# Altium footprint library Footprints.PcbLib: 236 footprints (part 13 of 15)
Each footprint in its own frame and in the unit in brackets; x right, y up, seen from the top. Pads: shape width x height; smd on the part's side, far side on the other; paste and mask are expansions set on the pad; w line width, h text height; cw(c..) or ccw(c..) is an arc to the next point about the centre after c.
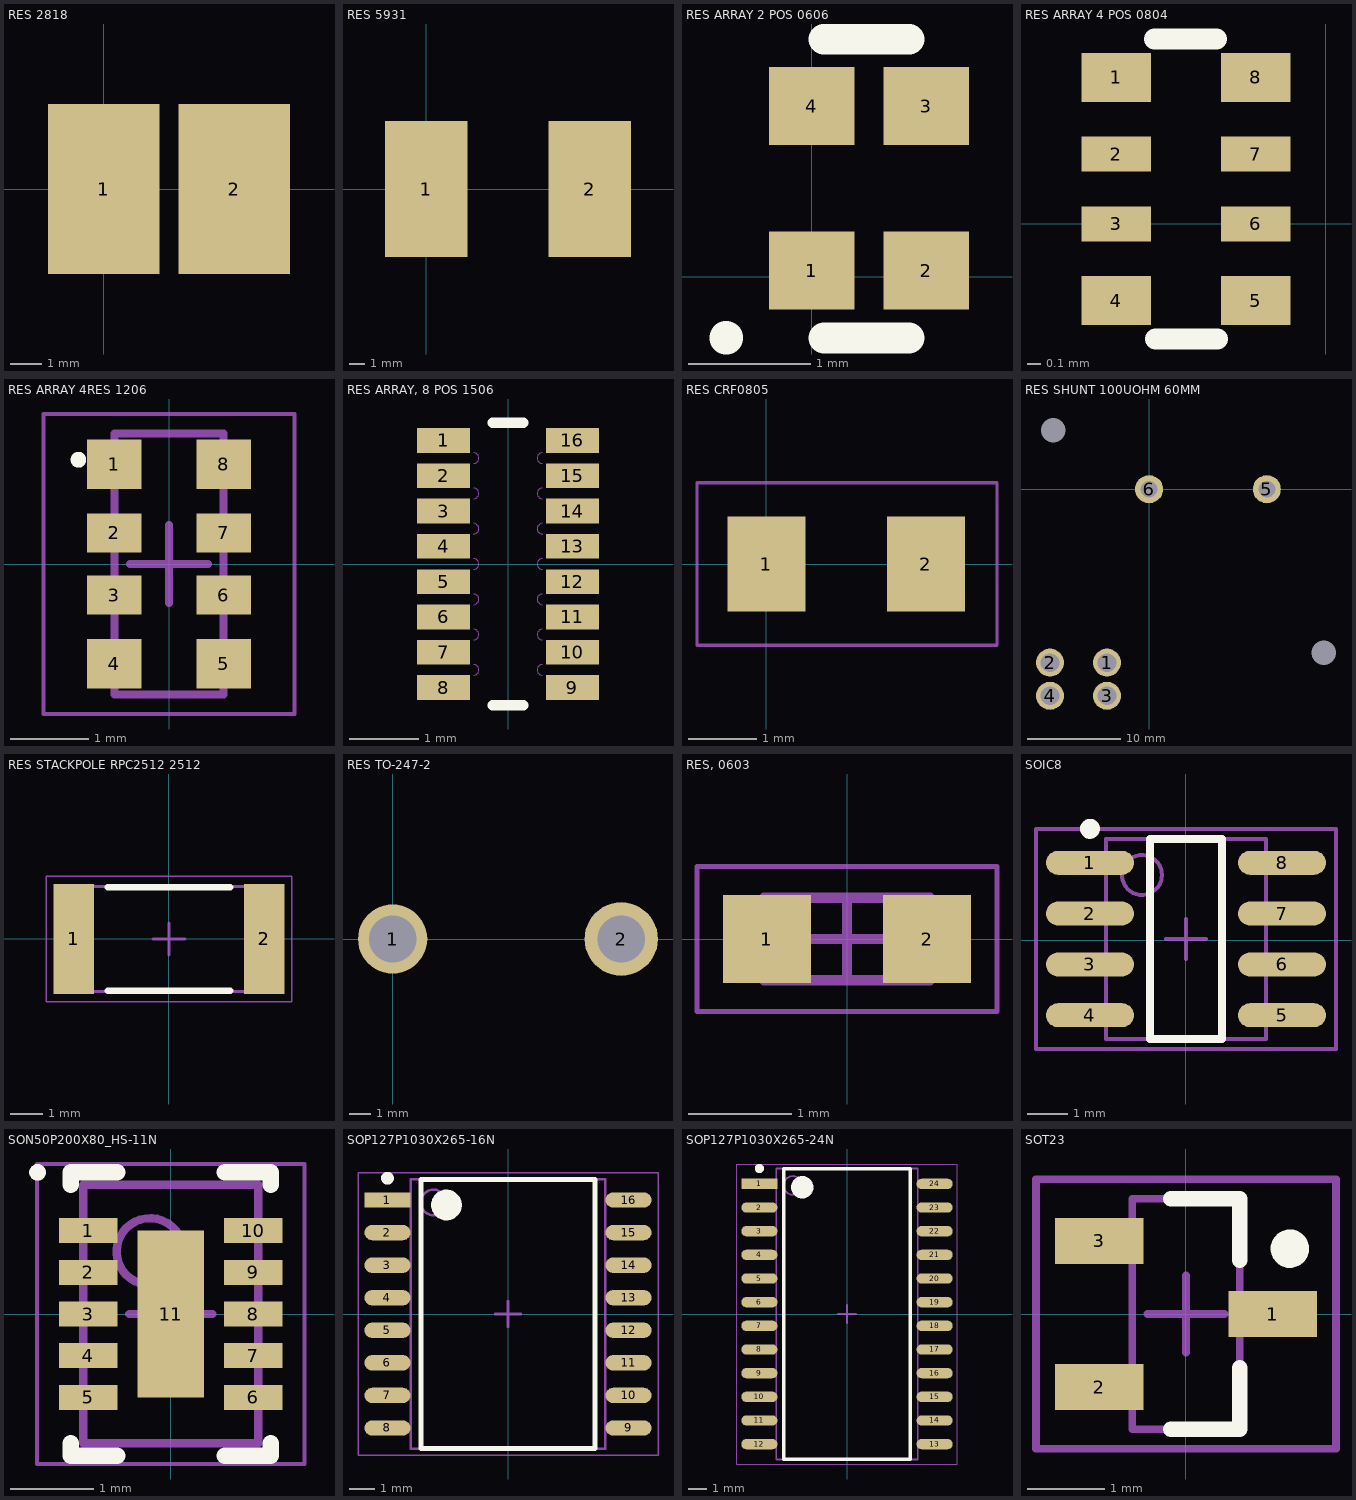
[diagram p12: the footprints below, top view; thin cyan lines are the x and y axes]

## RES 2818 [mm]
pads (2):
  rect 3.51x5.33 smd: 1(0,0) 2(4.1,0)
3D body "WSHM2818.stp": height 1.35, standoff -0.15, extent -1.525,-2.325 5.575,2.275

## RES 5931 [mm]
pads (2):
  rect 5.45x9 smd: 1(0,0) 2(10.8,0)
3D body "WSL5931 (0.003).stp": height 0.77, standoff 0, extent -2.25,-4 12.75,3.75

## RES ARRAY 2 POS 0606 [mm]
pads (4):
  rect 0.7x0.64 smd: 1(0,0.05) 2(0.94,0.05) 3(0.94,1.4) 4(0,1.4)
Top Overlay:
  circle w0.254: c-0.7,-0.5 r0.01
  lines w0.254: 0.1,-0.5 0.8,-0.5 ; 0.1,1.95 0.8,1.95
3D body "ACAS_0606.stp": height 0.45, standoff 0, extent -0.281,-0.072 1.219,1.528

## RES ARRAY 4 POS 0804 [mm] "Panasonic Electronic Components EXB-N8V511JX"
height 0.7
pads (8):
  rect 0.5x0.35 smd: 1(-1.5,1.05) 4(-1.5,-0.55) 5(-0.5,-0.55) 8(-0.5,1.05)
  rect 0.5x0.25 smd: 2(-1.5,0.5) 3(-1.5,0) 6(-0.5,0) 7(-0.5,0.5)
Top Overlay:
  lines w0.152: -1.225,1.325 -0.781,1.325 ; -1.219,-0.825 -0.775,-0.825
3D body "User Library-4xRes_0402.step": height 0.36, standoff -0.01, extent -1.5,-0.75 -0.5,1.25

## RES ARRAY 4RES 1206 [mm] "Chip Array, Flat, 8-Leads, Pitch 0.80mm,  Body 3.20x1.60mm,  IPC Medium Density"
height 1
pads (8):
  rect 0.7x0.64 smd: 1(-0.7,1.28) 4(-0.7,-1.28) 5(0.7,-1.28) 8(0.7,1.28)
  rect 0.7x0.5 smd: 2(-0.7,0.4) 3(-0.7,-0.4) 6(0.7,-0.4) 7(0.7,0.4)
Top Overlay:
  circle w0.1: c-1.162,1.338 r0.05
Mechanical 13:
  lines w0.1: -0.7,-1.675 -0.7,1.675 0.7,1.675 0.7,-1.675 -0.7,-1.675
Mechanical 15:
  lines w0.05: -1.61,-1.925 -1.61,1.925 1.61,1.925 1.61,-1.925 -1.61,-1.925
  lines w0.1: -0.5,0 0.5,0 ; 0,-0.5 0,0.5
3D body "ACAS 0612.stp": height 0.45, standoff 0, extent -0.813,-1.6 0.687,1.6

## RES ARRAY, 8 POS 1506 [mil]
pads (16):
  rect 30x14 smd: 1(-36.5,70) 2(-36.5,50) 3(-36.5,30) 4(-36.5,10) 5(-36.5,-10) 6(-36.5,-30) 7(-36.5,-50) 8(-36.5,-70) 9(36.5,-70) 10(36.5,-50) 11(36.5,-30) 12(36.5,-10) 13(36.5,10) 14(36.5,30) 15(36.5,50) 16(36.5,70)
Top Overlay:
  lines w6: -8.75,-80 8.75,-80 ; -8.75,80 8.75,80
Mechanical 13:
  lines w0: -19.5,-63 ccw(c-19.5,-60) -19.5,-57 ; -19.5,-43 ccw(c-19.5,-40) -19.5,-37 ; -19.5,-23 ccw(c-19.5,-20) -19.5,-17 ; -19.5,-3 ccw(c-19.5,0) -19.5,3 ; -19.5,17 ccw(c-19.5,20) -19.5,23 ; -19.5,37 ccw(c-19.5,40) -19.5,43 ; -19.5,57 ccw(c-19.5,60) -19.5,63 ; 19.5,-63 cw(c19.5,-60) 19.5,-57 ; 19.5,-43 cw(c19.5,-40) 19.5,-37 ; 19.5,-23 cw(c19.5,-20) 19.5,-17 ; 19.5,-3 cw(c19.5,0) 19.5,3 ; 19.5,17 cw(c19.5,20) 19.5,23 ; 19.5,37 cw(c19.5,40) 19.5,43 ; 19.5,57 cw(c19.5,60) 19.5,63
3D body "EXB2HV.stp": height 18.03, standoff 0, extent -20.51,-77.01 20.51,77.01

## RES CRF0805 [mm]
pads (2):
  rect 1.15x1.4 smd: 1(0,0) 2(2.35,0)
Mechanical 15:
  lines w0.05: -1.025,-1.2 -1.025,1.2 3.4,1.2 3.4,-1.2 -1.025,-1.2
3D body "CRF0805-FX-R005ELF--3DModel-STEP-46669.STEP": height 0.8, standoff 0, extent 0.2,-0.625 2.2,0.625

## RES SHUNT 100UOHM 60MM [mm]
pads (8):
  round 0 hole 2.6: 0(-10.25,6.3) 0(18.7,-17.5)
  round 3 hole 2: 1(-4.5,-18.55) 2(-10.6,-18.55) 3(-4.5,-22.1) 4(-10.6,-22.1)
  round 3 hole 1.8: 5(12.6,0) 6(0,0)
3D body "WSBM8518_100µO.STEP": height 6.58, standoff -21.08, extent -36.002,-29.031 48.986,11.463

## RES STACKPOLE RPC2512 2512 [mm] "Chip Resistor, 2-Leads, Body 6.30x3.10mm, IPC Medium Density"
height 0.65
pads (2):
  rect 1.25x3.4 smd: 1(-2.95,0) 2(2.95,0)
Top Overlay:
  lines w0.2: -1.9,-1.6 1.9,-1.6 ; -1.9,1.6 1.9,1.6
Mechanical 13:
  lines w0.1: -3.175,-1.625 3.175,-1.625 3.175,1.625 -3.175,1.625 -3.175,-1.625
Mechanical 15:
  lines w0.05: -3.8,-1.95 3.8,-1.95 3.8,1.95 -3.8,1.95 -3.8,-1.95
  lines w0.1: -0.5,0 0.5,0 ; 0,-0.5 0,0.5
3D body "RES STACKPOLE RPC2512 2512.step": height 0.65, standoff 0, extent -3.175,-1.625 3.175,1.625

## RES TO-247-2 [mm]
pads (2):
  round 3.3 hole 2.25: 1(0,0)
  round 3.5 hole 2.25: 2(10.88,0)
3D body: height 33.5, standoff -5.5, extent 10.88,0 10.88,0
3D body: height 30.47, standoff -5.5, extent 10.88,0 10.88,0
3D body "TO-247H.SLDPRT": height 25.5, standoff -10.47, extent -2.37,-2.75 13.13,2.25

## RES, 0603 [mm] "Chip Resistor, 2-Leads, Body 1.60x0.80mm, IPC Medium Density"
height 0.55
pads (2):
  rect 0.85x0.85 smd: 1(-0.775,0) 2(0.775,0)
Mechanical 13:
  lines w0.1: -0.8,-0.4 -0.8,0.4 0.8,0.4 0.8,-0.4 -0.8,-0.4
Mechanical 15:
  lines w0.05: -1.45,-0.7 -1.45,0.7 1.45,0.7 1.45,-0.7 -1.45,-0.7
  lines w0.1: -0.4,0 0.4,0 ; 0,-0.4 0,0.4
3D body "RESC1608X06N.step": height 0.55, standoff 0, extent -0.8,-0.4 0.8,0.4

## SOIC8 [mm]
pads (8):
  oval 2.2x0.6 smd: 1(-2.394,1.935) 2(-2.394,0.665) 3(-2.394,-0.605) 4(-2.394,-1.875) 5(2.406,-1.875) 6(2.406,-0.605) 7(2.406,0.665) 8(2.406,1.935)
Top Overlay:
  circle w0.25: c-2.394,2.785 r0.125
  lines w0.2: -0.894,-2.47 0.906,-2.47 0.906,2.53 -0.894,2.53 -0.894,-2.47
Mechanical 13:
  circle w0.1: c-1.094,1.63 r0.5
  lines w0.1: -1.994,-2.47 2.006,-2.47 2.006,2.53 -1.994,2.53 -1.994,-2.47
Mechanical 15:
  lines w0.1: -0.494,0.03 0.506,0.03 ; 0.006,-0.47 0.006,0.53 ; -3.744,-2.72 3.756,-2.72 3.756,2.78 -3.744,2.78 -3.744,-2.72
3D body: height 1.75, standoff 0, extent -1.994,-2.47 2.006,2.53

## SON50P200X80_HS-11N [mm] "SON, 10-Leads, Body 3.00x2.00mm, Pitch 0.50mm, Thermal Pad 2.00x0.69mm, IPC Medium Density"
height 0.8
pads (11):
  rect 0.7x0.3 smd: 1(-0.99,1) 2(-0.99,0.5) 3(-0.99,0) 4(-0.99,-0.5) 5(-0.99,-1) 6(0.99,-1) 7(0.99,-0.5) 8(0.99,0) 9(0.99,0.5) 10(0.99,1)
  rect 0.8x2 smd: 11(0,0)
Top Overlay:
  circle w0.1: c-1.6,1.7 r0.05
  lines w0.2: -1.2,-1.55 -1.2,-1.7 -0.645,-1.7 ; -1.2,1.55 -1.2,1.7 -0.645,1.7 ; 0.645,-1.7 1.2,-1.7 1.2,-1.55 ; 0.645,1.7 1.2,1.7 1.2,1.55
Mechanical 13:
  circle w0.1: c-0.25,0.75 r0.4
  lines w0.1: -1.05,-1.55 1.05,-1.55 1.05,1.55 -1.05,1.55 -1.05,-1.55
Mechanical 15:
  lines w0.05: -1.605,-1.8 1.605,-1.8 1.605,1.8 -1.605,1.8 -1.605,-1.8
  lines w0.1: -0.5,0 0.5,0 ; 0,-0.5 0,0.5
3D body "SON50P200X80_HS-11N.step": height 0.8, standoff 0, extent -1.051,-1.55 1.051,1.55

## SOP127P1030X265-16N [mm] "SOP, 16-Leads, Body 10.30x7.51mm, Pitch 1.27mm, IPC Medium Density"
height 2.65
pads (16):
  rect 1.8x0.6 smd: 1(-4.7,4.445)
  oval 1.8x0.6 smd: 2(-4.7,3.175) 3(-4.7,1.905) 4(-4.7,0.635) 5(-4.7,-0.635) 6(-4.7,-1.905) 7(-4.7,-3.175) 8(-4.7,-4.445) 9(4.7,-4.445) 10(4.7,-3.175) 11(4.7,-1.905) 12(4.7,-0.635) 13(4.7,0.635) 14(4.7,1.905) 15(4.7,3.175) 16(4.7,4.445)
Top Overlay:
  circle w0.25: c-4.7,5.295 r0.125
  circle w0.6: c-2.4,4.25 r0.3
  lines w0.2: -3.4,-5.25 -3.4,5.25 3.4,5.25 3.4,-5.25 -3.4,-5.25
Assembly Top (Mech9):
  circle w0.1: c-2.9,4.35 r0.5
  lines w0.1: -3.8,-5.25 -3.8,5.25 3.8,5.25 3.8,-5.25 -3.8,-5.25
Courtyard Top (Mech11):
  lines w0.05: -5.85,-5.5 -5.85,5.5 5.85,5.5 5.85,-5.5 -5.85,-5.5
  lines w0.1: -0.5,0 0.5,0 ; 0,-0.5 0,0.5
3D body "SOP127P1030X265-16N.step": height 2.65, standoff 0, extent -5.15,-5.25 5.15,5.25

## SOP127P1030X265-24N [mm] "SOP, 24-Leads, Body 15.40x7.50mm, Pitch 1.27mm, IPC Medium Density"
height 2.65
pads (24):
  rect 1.95x0.55 smd: 1(-4.7,6.985)
  oval 1.95x0.55 smd: 2(-4.7,5.715) 3(-4.7,4.445) 4(-4.7,3.175) 5(-4.7,1.905) 6(-4.7,0.635) 7(-4.7,-0.635) 8(-4.7,-1.905) 9(-4.7,-3.175) 10(-4.7,-4.445) 11(-4.7,-5.715) 12(-4.7,-6.985) 13(4.7,-6.985) 14(4.7,-5.715) 15(4.7,-4.445) 16(4.7,-3.175) 17(4.7,-1.905) 18(4.7,-0.635) 19(4.7,0.635) 20(4.7,1.905) 21(4.7,3.175) 22(4.7,4.445) 23(4.7,5.715) 24(4.7,6.985)
Top Overlay:
  circle w0.6: c-2.4,6.8 r0.3
  circle w0.25: c-4.7,7.81 r0.125
  lines w0.2: -3.4,-7.8 3.4,-7.8 3.4,7.8 -3.4,7.8 -3.4,-7.8
Mechanical 13:
  circle w0.1: c-2.9,6.9 r0.5
  lines w0.1: -3.8,-7.8 3.8,-7.8 3.8,7.8 -3.8,7.8 -3.8,-7.8
Mechanical 15:
  lines w0.05: -5.925,-8.05 5.925,-8.05 5.925,8.05 -5.925,8.05 -5.925,-8.05
  lines w0.1: -0.5,0 0.5,0 ; 0,-0.5 0,0.5
3D body "SOP127P1030X265-24N.step": height 2.65, standoff 0, extent -5.15,-7.8 5.15,7.8

## SOT23 [mm] "SOT23, 3-Leads, Body 2.9x1.3mm, Pitch 0.95mm, Lead Span 2.3mm - Reverse Pinning, IPC Medium Density"
height 1.1
pads (3):
  rect 1.15x0.6 smd: 1(1.125,0) 2(-1.125,-0.95) 3(-1.125,0.95)
Top Overlay:
  circle w0.25: c1.35,0.85 r0.125
  lines w0.2: -0.2,-1.5 0.7,-1.5 0.7,-0.7 ; -0.2,1.5 0.7,1.5 0.7,0.7
Mechanical 13:
  lines w0.1: -0.7,-1.5 0.7,-1.5 0.7,1.5 -0.7,1.5 -0.7,-1.5
Mechanical 15:
  lines w0.1: -0.5,0 0.5,0 ; 0,-0.5 0,0.5 ; -1.95,-1.75 1.95,-1.75 1.95,1.75 -1.95,1.75 -1.95,-1.75
3D body: height 1.1, standoff 0, extent -0.7,-1.5 0.7,1.5